# Altium footprint library NDLib.PCBLIB: 499 footprints (part 27 of 32)
Each footprint in its own frame and in the unit in brackets; x right, y up, seen from the top. Pads: shape width x height; smd on the part's side, far side on the other; paste and mask are expansions set on the pad; w line width, h text height; cw(c..) or ccw(c..) is an arc to the next point about the centre after c.
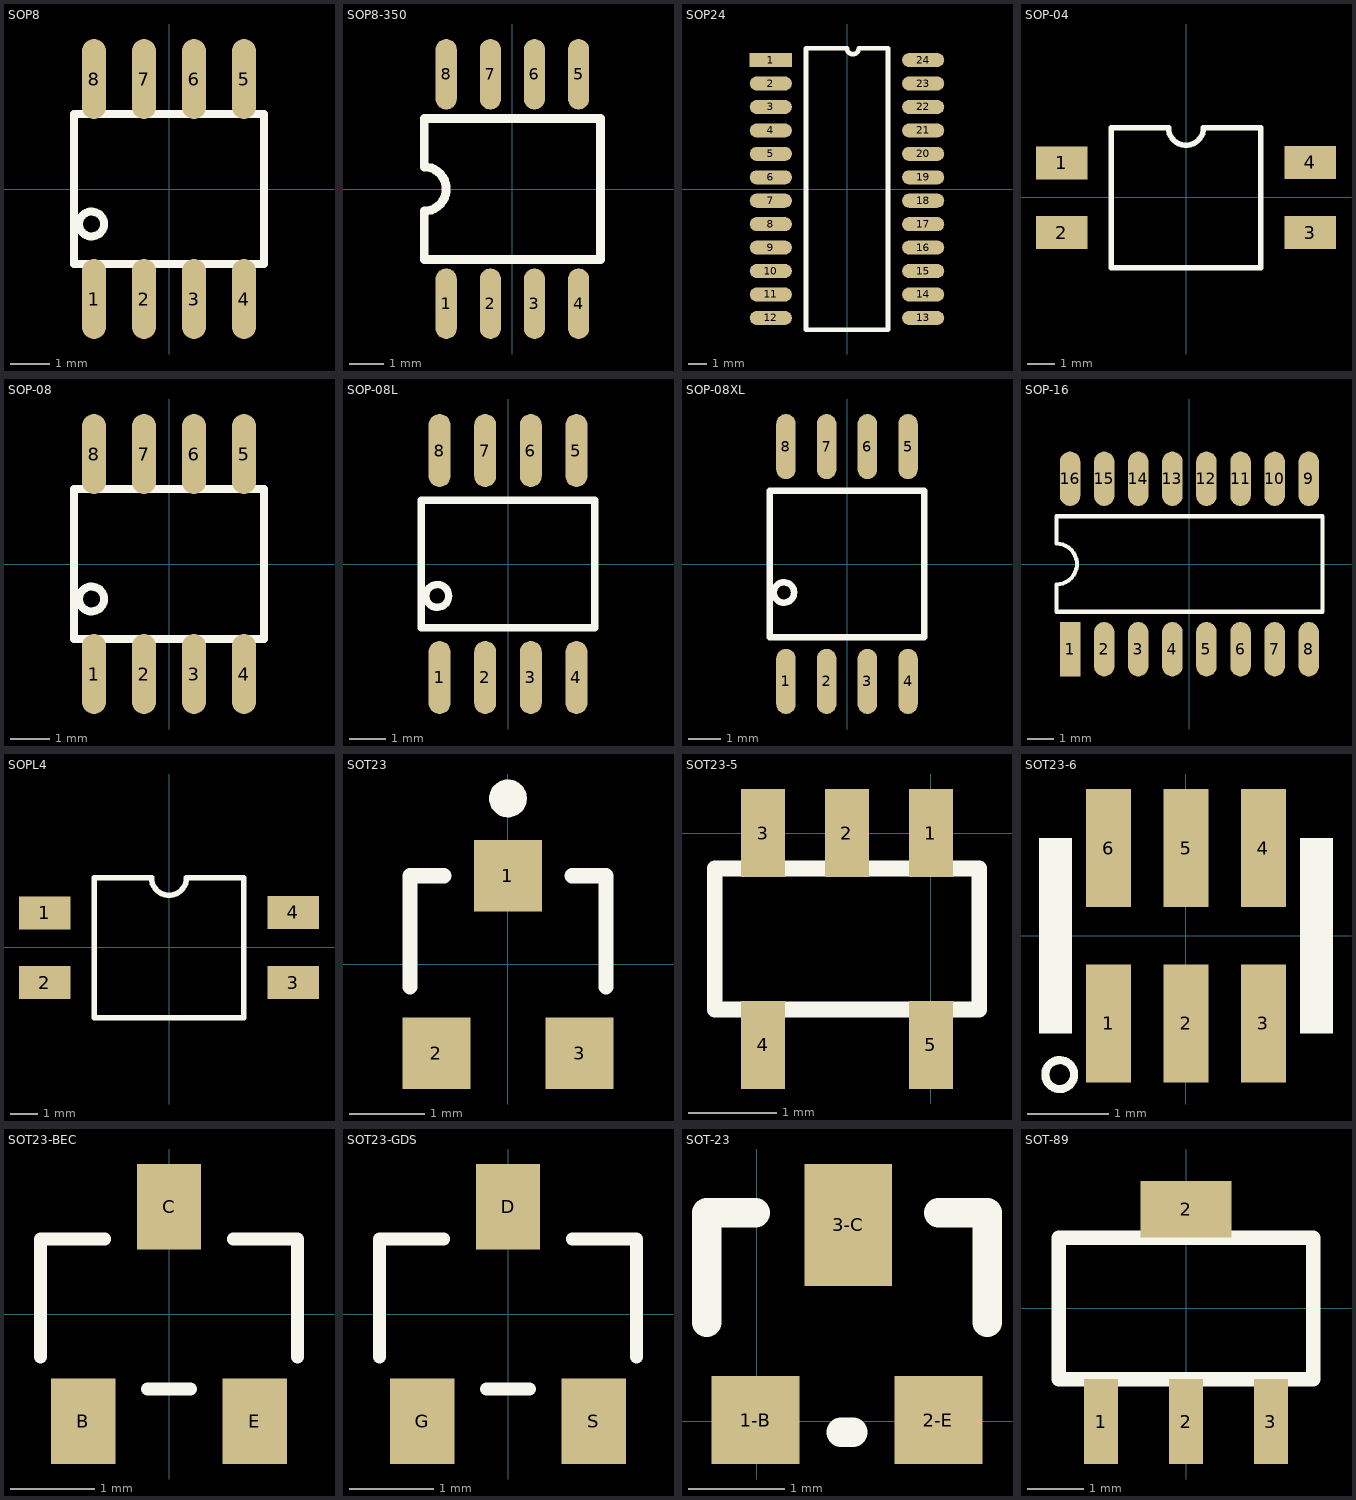
[diagram p26: the footprints below, top view; thin cyan lines are the x and y axes]

## SOP8 [mil]
pads (8):
  oval 24x80 smd: 1(-75,-110) 2(-25,-110) 3(25,-110) 4(75,-110) 5(75,110) 6(25,110) 7(-25,110) 8(-75,110)
TopOverlay:
  circle w8: c-77.5,-35 r12.5
  lines w8: -95,-75 95,-75 95,75 -95,75 -95,-75
3D body: height 61.02, standoff -1.97, extent -96.91,-117.91 96,117.91

## SOP8-350 [mil]
pads (8):
  oval 24x80 smd: 1(-75,-130) 2(-25,-130) 3(25,-130) 4(75,-130) 5(75,130) 6(25,130) 7(-25,130) 8(-75,130)
TopOverlay:
  lines w10: -100,-80 -100,-25 ccw(c-100,0) -100,25 -100,80 100,80 100,-80 -100,-80

## SOP24 [mil]
pads (24):
  rect 90x30 smd: 1(-162.5,275)
  oval 90x30 smd: 2(-162.5,225) 3(-162.5,175) 4(-162.5,125) 5(-162.5,75) 6(-162.5,25) 7(-162.5,-25) 8(-162.5,-75) 9(-162.5,-125) 10(-162.5,-175) 11(-162.5,-225) 12(-162.5,-275) 13(162.5,-275) 14(162.5,-225) 15(162.5,-175) 16(162.5,-125) 17(162.5,-75) 18(162.5,-25) 19(162.5,25) 20(162.5,75) 21(162.5,125) 22(162.5,175) 23(162.5,225) 24(162.5,275)
TopOverlay:
  lines w10: -87.5,-300 -87.5,300 0,300 ccw(c12.5,300) 25,300 87.5,300 87.5,-300 -87.5,-300

## SOP-04 [mm]
height 2.54
pads (4):
  rect 1.865x1.2 smd: 1(-4.521,1.261) 2(-4.521,-1.279) 3(4.521,-1.279) 4(4.513,1.279)
TopOverlay:
  lines w0.2: -2.715,-2.549 -2.715,2.531 -0.635,2.531 ccw(c0,2.531) 0.635,2.531 2.715,2.531 2.715,-2.549 -2.715,-2.549

## SOP-08 [mil]
pads (8):
  oval 24x80 smd: 1(-75,-110) 2(-25,-110) 3(25,-110) 4(75,-110) 5(75,110) 6(25,110) 7(-25,110) 8(-75,110)
TopOverlay:
  circle w8: c-77.5,-35 r12.5
  lines w8: -95,-75 95,-75 95,75 -95,75 -95,-75
3D body: height 61.02, standoff -1.97, extent -96.91,-117.91 96,117.91

## SOP-08L [mil]
pads (8):
  oval 24x80 smd: 1(-75,-124.37) 2(-25,-124.37) 3(25,-124.37) 4(75,-124.37) 5(75,124.37) 6(25,124.37) 7(-25,124.37) 8(-75,124.37)
TopOverlay:
  circle w8: c-77.5,-35 r12.5
  lines w8: -95,-70 -95,70 95,70 95,-70 -95,-70
3D body: height 61.02, standoff -1.97, extent -96.91,-117.91 96,117.91

## SOP-08XL [mil]
pads (8):
  oval 24x80 smd: 1(-75,-144.37) 2(-25,-144.37) 3(25,-144.37) 4(75,-144.37) 5(75,144.37) 6(25,144.37) 7(-25,144.37) 8(-75,144.37)
TopOverlay:
  circle w8: c-77.5,-35 r12.5
  lines w8: -95,-90 95,-90 95,90 -95,90 -95,-90
3D body: height 61.02, standoff -1.97, extent -96.91,-117.91 96,117.91

## SOP-16 [mil]
height 20
pads (16):
  rect 30x80 smd: 1(-175,-125)
  oval 30x80 smd: 2(-125,-125) 3(-75,-125) 4(-25,-125) 5(25,-125) 6(75,-125) 7(125,-125) 8(175,-125) 9(175,125) 10(125,125) 11(75,125) 12(25,125) 13(-25,125) 14(-75,125) 15(-125,125) 16(-175,125)
TopOverlay:
  lines w6: -195,-70 -195,-30 ccw(c-195,0) -195,30 -195,70 195,70 195,-70 -195,-70
3D body: height 68.9, standoff 0, extent -193.83,-130 192,98.35

## SOPL4 [mm]
pads (4):
  rect 1.865x1.2 smd: 1(-4.521,1.261) 2(-4.521,-1.279) 3(4.521,-1.279) 4(4.513,1.279)
TopOverlay:
  lines w0.2: -2.715,-2.549 2.715,-2.549 2.715,2.531 0.635,2.531 cw(c0,2.531) -0.635,2.531 -2.715,2.531 -2.715,-2.549

## SOT23 [mm]
pads (3):
  rect 0.9x0.95 smd: 1(0,1.175) 2(-0.95,-1.175) 3(0.95,-1.175)
TopOverlay:
  circle w0.25: c0,2.2 r0.125
  lines w0.2: -1.3,-0.3 -1.3,1.175 -0.85,1.175 ; 0.85,1.175 1.3,1.175 1.3,-0.3
3D body: height 1.2, standoff 0, extent -1.45,-1.4 1.45,1.4

## SOT23-5 [mm]
pads (5):
  rect 0.5x1 smd: 1(0,0) 2(-0.95,0) 3(-1.9,0) 4(-1.9,-2.4) 5(0,-2.4)
TopOverlay:
  lines w0.178: -2.45,-2 -2.45,-0.4 0.55,-0.4 0.55,-2 -2.45,-2
3D body: height 1.09, standoff -0.01, extent -2.399,-2.599 0.5,0.201

## SOT23-6 [mm] "SOT-23/SC-74A; 5 Leads; Body 3.1 x 3 mm, inc. leads (LxW max)"
height 1.45
pads (6):
  rect 0.55x1.45 smd: 1(-0.95,-1.075) 2(0,-1.075) 3(0.95,-1.075) 4(0.95,1.075) 5(0,1.075) 6(-0.95,1.075)
TopOverlay:
  circle w0.1: c-1.549,-1.702 r0.177
  rectangle: -1.8,-1.2 -1.4,1.2
  region: 1.8,1.2 1.4,1.2 1.4,-1.2 1.8,-1.2
3D body: height 1.08, standoff -0.01, extent -1.397,-1.351 1.397,1.075

## SOT23-BEC [mil]
pads (3):
  rect 30x40 smd: B(-40,-50) C(0,50) E(40,-50)
TopOverlay:
  lines w6: -60,-20 -60,35 -30,35 ; -10,-35 10,-35 ; 30,35 60,35 60,-20
3D body: height 47.24, standoff 0, extent -57.08,-55.11 57.09,55.12

## SOT23-GDS [mil]
pads (3):
  rect 30x40 smd: D(0,50) G(-40,-50) S(40,-50)
TopOverlay:
  lines w6: -60,-20 -60,35 -30,35 ; -10,-35 10,-35 ; 30,35 60,35 60,-20
3D body: height 47.24, standoff 0, extent -57.08,-55.11 57.09,55.12

## SOT-23 [mil]
pads (3):
  rect 36x36 smd: 1-B(-0.42,0.38) 2-E(74.58,0.38)
  rect 36x50 smd: 3-C(37.58,80.38)
TopOverlay:
  lines w12: -20.42,40.38 -20.42,85.38 -0.42,85.38 ; 34.58,-4.62 39.58,-4.62 ; 74.58,85.38 94.58,85.38 94.58,40.38

## SOT-89 [mm]
pads (4):
  rect 0.6x1.5 smd: 1(-1.5,-2) 2(0,-2) 3(1.5,-2)
  rect 1.6x1 smd: 2(0,1.75)
TopOverlay:
  lines w0.254: -2.25,-1.25 -2.25,1.25 2.25,1.25 2.25,-1.25 -2.25,-1.25